# Altium footprint library User.PcbLib: 317 footprints (part 16 of 20)
Each footprint in its own frame and in the unit in brackets; x right, y up, seen from the top. Pads: shape width x height; smd on the part's side, far side on the other; paste and mask are expansions set on the pad; w line width, h text height; cw(c..) or ccw(c..) is an arc to the next point about the centre after c.
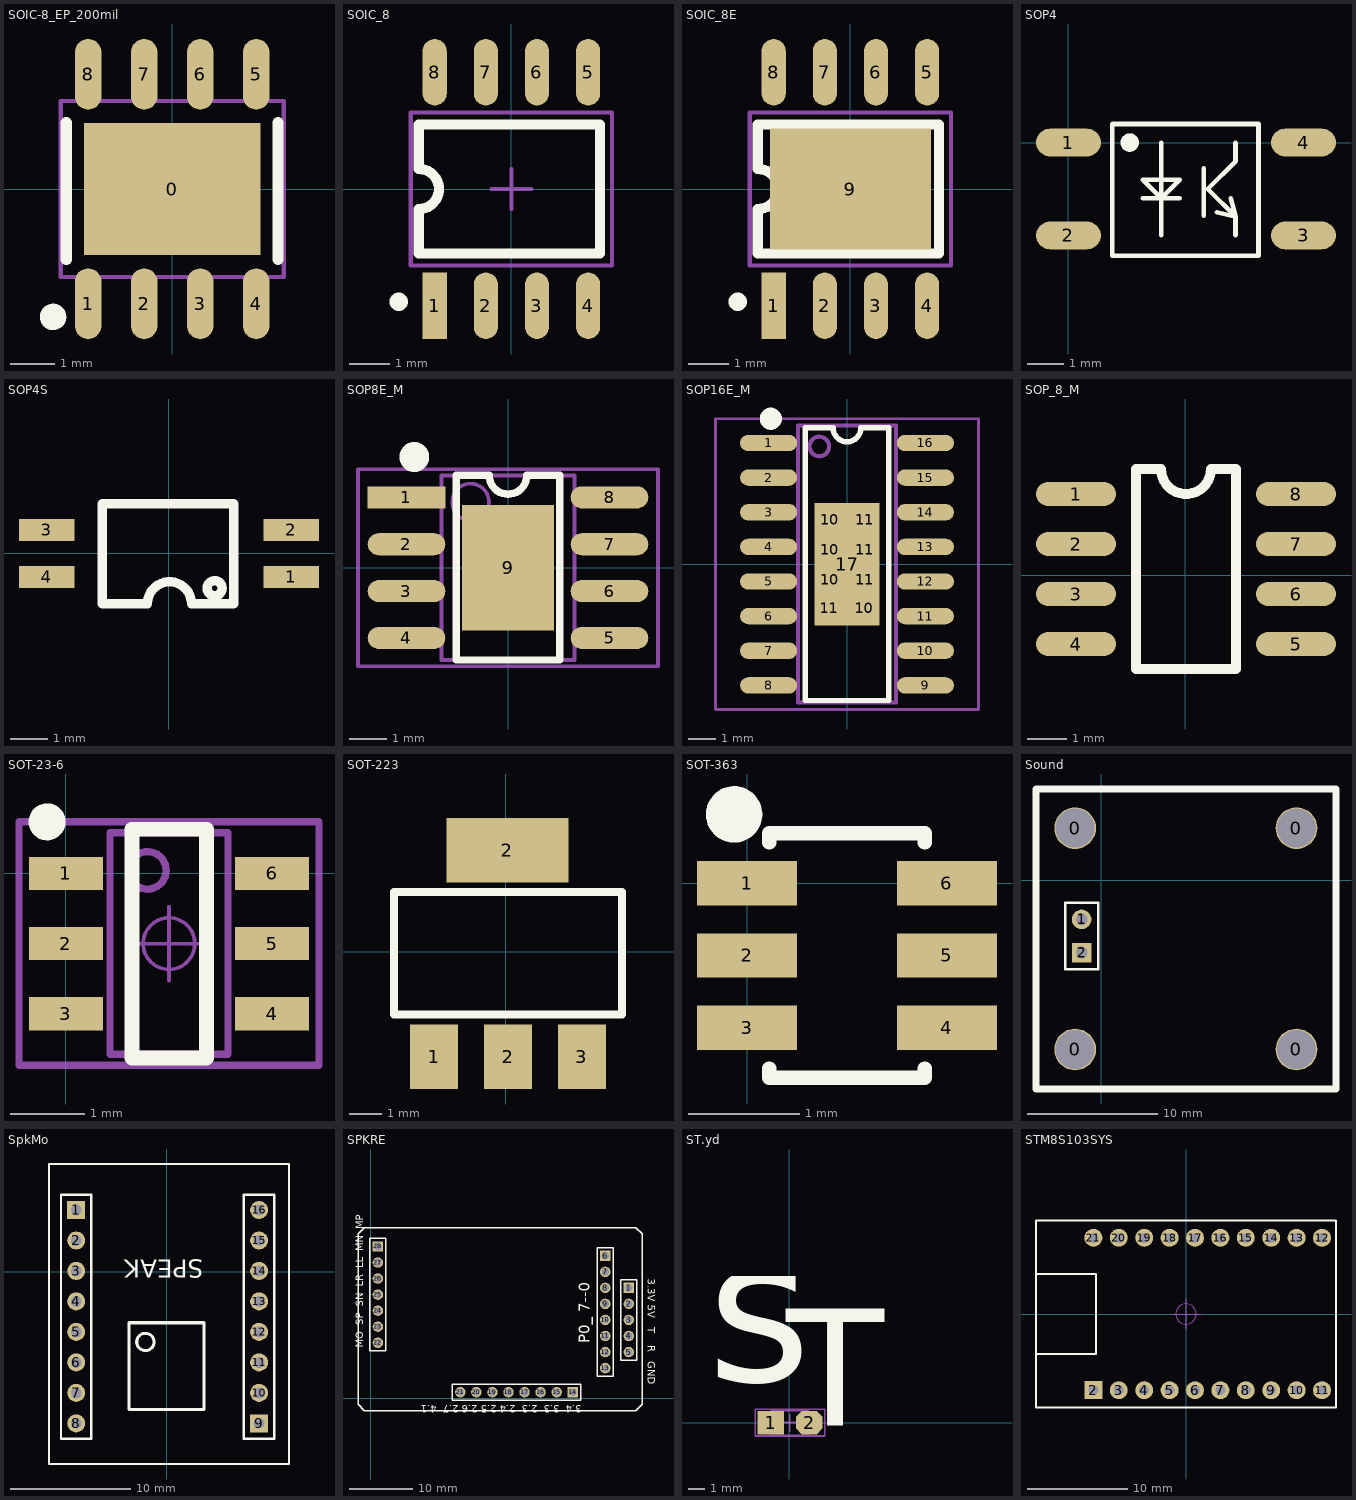
[diagram p15: the footprints below, top view; thin cyan lines are the x and y axes]

## SOIC-8_EP_200mil [mm] "52mm"
pads (9):
  rect 4x3 smd: 0(0,0)
  oval 0.6x1.6 smd: 1(-1.905,-2.6) 2(-0.635,-2.6) 3(0.635,-2.6) 4(1.905,-2.6) 5(1.905,2.6) 6(0.635,2.6) 7(-0.635,2.6) 8(-1.905,2.6)
Top Overlay:
  circle w0.3: c-2.7,-2.9 r0.15
  lines w0.254: -2.4,-1.6 -2.4,1.5 ; 2.4,-1.6 2.4,1.5
Mechanical 13:
  lines w0.1: -2.525,-1.995 -2.525,1.995 2.525,1.995 2.525,-1.995 -2.525,-1.995
3D body "SOIC8.STEP": height 1.75, standoff 0, extent -2.5,-3.006 2.5,3.006

## SOIC_8 [mm] "58mm"
pads (8):
  rect 0.6x1.65 smd: 1(-1.905,-2.9)
  oval 0.6x1.65 smd: 2(-0.635,-2.9) 3(0.635,-2.9) 4(1.905,-2.9) 5(1.905,2.9) 6(0.635,2.9) 7(-0.635,2.9) 8(-1.905,2.9)
Top Overlay:
  circle w0.254: c-2.8,-2.8 r0.1
  lines w0.254: -2.3,-1.6 2.2,-1.6 2.2,1.6 -2.3,1.6 -2.3,0.5 cw(c-2.3,0) -2.3,-0.5 -2.3,-1.6
Mechanical 15:
  lines w0.1: -0.5,0 0.5,0 ; 0,-0.5 0,0.5 ; -2.5,-1.9 2.5,-1.9 2.5,1.9 -2.5,1.9 -2.5,-1.9
3D body "SOIC8.STEP": height 1.75, standoff 0, extent -2.5,-3.006 2.5,3.006

## SOIC_8E [mm] "58mm"
pads (9):
  rect 0.6x1.65 smd: 1(-1.905,-2.9)
  oval 0.6x1.65 smd: 2(-0.635,-2.9) 3(0.635,-2.9) 4(1.905,-2.9) 5(1.905,2.9) 6(0.635,2.9) 7(-0.635,2.9) 8(-1.905,2.9)
  rect 4x3 smd: 9(0,0)
Top Overlay:
  circle w0.254: c-2.8,-2.8 r0.1
  lines w0.254: -2.3,-1.6 2.2,-1.6 2.2,1.6 -2.3,1.6 -2.3,0.5 cw(c-2.3,0) -2.3,-0.5 -2.3,-1.6
Mechanical 15:
  lines w0.1: -0.5,0 0.5,0 ; 0,-0.5 0,0.5 ; -2.5,-1.9 2.5,-1.9 2.5,1.9 -2.5,1.9 -2.5,-1.9
3D body "SOIC8.STEP": height 1.75, standoff 0, extent -2.5,-3.006 2.5,3.006

## SOP4 [mil] "AQY211G2S"
pads (4):
  oval 70x30 smd: 1(0,0) 2(0,-100) 3(253.23,-100) 4(253.23,0)
Top Overlay:
  circle w10: c65.94,0 r4.92
  lines w5: 80,-60 120,-60 ; 100,-100 100,0 ; 145.67,-78.74 145.67,-27.56 ; 160,-75 180,-80 ; 175,-60 180,-80 ; 180,-100 180,-80 ; 180,0 180,-20 150,-50 180,-80 ; 47.24,-121.73 47.24,20 204.72,20 204.72,-121.73 47.24,-121.73 ; 80,-40 120,-40 100,-60 80,-40
3D body "User Library-HCPL-181-1.STEP": height 78.74, standoff -3.96, extent -7.87,-122.05 267.72,19.69

## SOP4S [mm]
pads (4):
  rect 1.5x0.6 smd: 1(3.31,-0.635) 2(3.31,0.635) 3(-3.309,0.635) 4(-3.309,-0.635)
Top Overlay:
  circle w0.254: c1.235,-0.94 r0.203
  lines w0.254: -1.805,-1.361 -1.805,1.346 ; -1.794,-1.361 -0.582,-1.361 cw(c0.013,-1.361) 0.608,-1.361 1.751,-1.361 1.751,1.346 -1.786,1.346
3D body "SOP-4-1.step": height 2.1, standoff 0, extent -3.492,-1.397 3.507,1.403

## SOP8E_M [mm] "5.6*1.8mm（长宽高）"
height 1.75
pads (9):
  rect 2.1x0.6 smd: 1(-2.75,1.905)
  oval 2.1x0.6 smd: 2(-2.75,0.635) 3(-2.75,-0.635) 4(-2.75,-1.905) 5(2.75,-1.905) 6(2.75,-0.635) 7(2.75,0.635) 8(2.75,1.905)
  rect 2.5x3.4 smd paste-2: 9(0,0)
Top Overlay:
  circle w0.5: c-2.54,3 r0.155
  lines w0.2: -1.397,2.5 -1.397,-2.5 1.397,-2.5 1.397,2.5
  lines w0.203: -1.397,2.5 -0.508,2.5 ccw(c0,2.5) 0,1.992 ccw(c0,2.5) 0.508,2.5 1.397,2.5
Mechanical 13:
  circle w0.1: c-1.016,1.778 r0.5
  lines w0.1: -1.8,-2.5 1.8,-2.5 1.8,2.5 -1.8,2.5 -1.8,-2.5
Mechanical 15:
  circle w0.05: c0,0 r0.35
  lines w0.05: -0.5,0 0.5,0 ; 0,-0.5 0,0.5
  lines w0.1: -4.064,-2.667 4.064,-2.667 4.064,2.667 -4.064,2.667 -4.064,-2.667
3D body "ESOP8.STEP": height 1.53, standoff -0.01, extent -3.003,-2.5 3.003,2.5

## SOP16E_M [mm] "10.3*6.2*1.8mm（长宽高）"
height 1.75
pads (25):
  oval 2.1x0.6 smd: 1(-2.875,4.445) 2(-2.875,3.175) 3(-2.875,1.905) 4(-2.875,0.635) 5(-2.875,-0.635) 6(-2.875,-1.905) 7(-2.875,-3.175) 8(-2.875,-4.445) 9(2.875,-4.445) 10(2.875,-3.175) 11(2.875,-1.905) 12(2.875,-0.635) 13(2.875,0.635) 14(2.875,1.905) 15(2.875,3.175) 16(2.875,4.445)
  rect 0.9x0.7 on Top Paste: 10(-0.625,-0.575) 10(-0.625,0.525) 10(-0.625,1.625) 10(0.625,-1.625) 11(-0.65,-1.625) 11(0.65,-0.575) 11(0.65,0.525) 11(0.65,1.625)
  rect 2.4x4.5 smd paste-3: 17(0,0)
Top Overlay:
  circle w0.5: c-2.794,5.334 r0.155
  lines w0.2: -1.524,5 -1.524,-5 1.524,-5 1.524,5
  lines w0.203: -1.524,5 -0.508,5 ccw(c0,5) 0,4.492 ccw(c0,5) 0.508,5 1.524,5
Mechanical 13:
  circle w0.15: c-1.016,4.318 r0.359
  lines w0.15: -1.8,-5.08 1.8,-5.08 1.8,5.08 -1.8,5.08 -1.8,-5.08
Mechanical 15:
  circle w0.05: c0,0 r0.35
  lines w0.05: -0.5,0 0.5,0 ; 0,-0.5 0,0.5
  lines w0.1: -4.826,-5.334 -4.826,5.334 4.826,5.334 4.826,-5.334 -4.826,-5.334
3D body "ESOP16.STEP": height 1.53, standoff -0.03, extent -3.003,-5 3.003,5

## SOP_8_M [mil] "5.58"
pads (8):
  oval 80x24 smd: 1(-109,81) 2(-109,31) 3(-109,-19) 4(-109,-69) 5(111,-69) 6(111,-19) 7(111,31) 8(111,81)
Top Overlay:
  lines w10: -49,-94 51,-94 51,106 26,106 cw(c1,106) -24,106 -49,106 -49,-94
3D body "SOP8.STEP": height 62.99, standoff 0, extent -116.7,-91.62 121.17,106.02

## SOT-23-6 [mm]
pads (6):
  rect 1x0.45 smd: 1(0,0) 2(0,-0.95) 3(0,-1.9) 4(2.794,-1.9) 5(2.794,-0.95) 6(2.794,0)
Top Overlay:
  circle w0.25: c-0.254,0.7 r0.125
  lines w0.2: 0.897,-2.5 0.897,0.6 1.905,0.6 1.905,-2.5 0.897,-2.5
Mechanical 13:
  circle w0.1: c1.105,0.042 r0.254
  lines w0.1: 0.597,-2.45 2.197,-2.45 2.197,0.55 0.597,0.55 0.597,-2.45
Mechanical 15:
  circle w0.05: c1.397,-0.95 r0.35
  lines w0.05: 0.897,-0.95 1.897,-0.95 ; 1.397,-1.45 1.397,-0.45
  lines w0.1: -0.635,-2.6 3.429,-2.6 3.429,0.7 -0.635,0.7 -0.635,-2.6
3D body "SOT23-6.STEP": height 1.15, standoff -0.03, extent -0.007,-2.45 2.8,0.55

## SOT-223 [mil]
pads (4):
  rect 59x79 smd: 1(-88,-129) 2(2.55,-129) 3(93.1,-129)
  rect 150x79 smd: 2(1.88,124.54)
Top Overlay:
  lines w10: -137.45,-77 142.55,-77 142.55,73 -137.45,73 -137.45,-77
3D body "SOT-223_MP04A.STEP": height 66.93, standoff 0, extent -126.41,-137.72 129.5,136.3

## SOT-363 [mm] "ina199"
pads (6):
  rect 0.9x0.4 smd: 1(0,0) 2(0,-0.65) 3(0,-1.3) 4(1.8,-1.3) 5(1.8,-0.65) 6(1.8,0)
Top Overlay:
  circle w0.254: c-0.116,0.62 r0.127
  lines w0.127: 0.2,-1.668 0.2,-1.75 1.6,-1.75 1.6,-1.668 ; 0.2,0.368 0.2,0.45 1.6,0.45 1.6,0.368
3D body "User Library-SOT-23-6.STEP": height 1.08, standoff -0.01, extent -0.368,-2.032 2.057,0.762

## Sound [mm]
pads (6):
  round 3.2 hole 3: 0(-2,-12.97) 0(-2,4) 0(14.97,-12.97) 0(14.97,4)
  round 1.5 hole 0.9: 1(-1.5,-3)
  rect 1.5x1.5 hole 0.9: 2(-1.5,-5.54)
Top Overlay:
  lines w0.2: -2.77,-6.81 -0.23,-6.81 -0.23,-1.73 -2.77,-1.73 -2.77,-6.81
  lines w0.5: -5,-16 18,-16 18,7 -5,7 -5,-16
3D body: height 20, standoff 16, extent -5,-16 18,7

## SpkMo [mm]
pads (16):
  rect 1.5x1.5 hole 0.9: 1(-7.544,5.131) 9(7.696,-12.649)
  round 1.5 hole 0.9: 2(-7.544,2.591) 3(-7.544,0.051) 4(-7.544,-2.489) 5(-7.544,-5.029) 6(-7.544,-7.569) 7(-7.544,-10.109) 8(-7.544,-12.649) 10(7.696,-10.109) 11(7.696,-7.569) 12(7.696,-5.029) 13(7.696,-2.489) 14(7.696,0.051) 15(7.696,2.591) 16(7.696,5.131)
Top Overlay:
  circle w0.254: c-1.778,-5.867 r0.723
  lines w0.2: -9.811,-16.038 10.189,-16.038 10.189,8.962 -9.811,8.962 -9.811,-16.038 ; -8.814,-13.919 -8.814,6.401 -6.274,6.401 -6.274,-13.919 -8.814,-13.919 ; 6.426,-13.919 8.966,-13.919 8.966,6.401 6.426,6.401 6.426,-13.919
  lines w0.254: -3.161,-11.506 -3.161,-4.267 3.124,-4.267 3.124,-11.506 -3.161,-11.506
  text "SPEAK" at 3.052,1.5 h2.54
3D body "HEADER 2.54X8.stp": height -3.1, standoff -14.3, extent 6.447,-13.919 8.945,6.401
3D body "HEADER 2.54X8.stp": height -3.1, standoff -14.3, extent -8.793,-13.919 -6.295,6.401
3D body "ESOP8.STEP": height 13.53, standoff 11.99, extent -3.275,-11.393 2.73,-6.393
3D body: height 12, standoff 11, extent -9.804,-16.002 10.262,8.966
3D body "USB micro_D.STEP": height 14.79, standoff 11.05, extent -4.083,2.882 3.888,9.582

## SPKRE [mil] "SPKAI"
pads (28):
  rect 65x65 hole 47.24: 1(1609.37,686.89) 6(1462.37,886.88) 14(1259.37,37.01) 28(45.43,944.88)
  round 65 hole 47.24: 2(1609.37,586.89) 3(1609.37,486.89) 4(1609.37,386.89) 5(1609.37,286.89) 7(1462.37,786.88) 8(1462.37,686.88) 9(1462.37,586.88) 10(1462.37,486.88) 11(1462.37,386.88) 12(1462.37,286.88) 13(1462.37,186.88) 15(1159.37,37.01) 16(1059.37,37.01) 17(959.37,37.01) 18(859.37,37.01) 19(759.37,37.01) 20(659.37,37.01) 21(559.37,37.01) 22(45.43,344.88) 23(45.43,444.88) 24(45.43,544.88) 25(45.43,644.88) 26(45.43,744.88) 27(45.43,844.88)
Top Overlay:
  lines w7.87: -78.74,-39.37 -78.74,1023.62 -39.37,1062.99 1653.54,1062.99 1692.91,1023.62 1692.91,-39.37 1653.54,-78.74 39.37,-78.74 ; -78.61,-39.24 -39.24,-78.61 39.5,-78.61 ; -4.57,294.88 95.43,294.88 95.43,994.88 -4.57,994.88 -4.57,294.88 ; 509.37,-12.99 1309.37,-12.99 1309.37,87.01 509.37,87.01 509.37,-12.99 ; 1412.37,136.88 1512.37,136.88 1512.37,936.88 1412.37,936.88 1412.37,136.88 ; 1559.37,236.89 1659.37,236.89 1659.37,736.89 1559.37,736.89 1559.37,236.89
  text "MO  SP  SN  LR  LL  MN  MP" at -29.94,314 h78.74
  text "P0_ 7--0" at 1390,341 h118.11
  text "3.4  3.3  2.3  2.4 2.5 2.6 2.7  4.1" at 1316,-27.87 h78.74
  text "3.3V 5V   T    R   GND" at 1712.6,744.88 h78.74
Bottom Overlay:
  lines w7: 1495.37,136.88 1504.37,145.88
3D body: height 472.44, standoff 433.07, extent -81,-94 1696,1067

## ST.yd [mm]
pads (2):
  rect 1.6x1.4 smd: 1(-1.099,0.008)
  oct 1.6x1.4 smd: 2(1.201,0.008)
Top Overlay:
  text "T" at -0.178,-2.466 h12
  text "s" at -4.899,-0.542 h16
Top Solder:
  text "科技协会" at 2.565,-1.626 h5
Mechanical 13:
  lines w0.1: -1.064,-0.746 -1.064,0.733 1.136,0.733 1.136,-0.746 -1.064,-0.746
Mechanical 15:
  lines w0.1: -0.464,0.008 0.536,0.008 ; 0.036,-0.492 0.036,0.508 ; -2.024,-0.792 -2.024,0.808 2.126,0.808 2.126,-0.792 -2.024,-0.792
3D body "LED0805(R).STEP": height 1.1, standoff 0, extent -0.974,-0.617 1.046,0.633

## STM8S103SYS [mm] "STM8S103核心板"
pads (20):
  rect 1.8x1.8 hole 1 unplated: 2(-9.26,-7.62)
  round 1.8 hole 1 unplated: 3(-6.72,-7.62) 4(-4.18,-7.62) 5(-1.64,-7.62) 6(0.9,-7.62) 7(3.44,-7.62) 8(5.98,-7.62) 9(8.52,-7.62) 10(11.06,-7.62) 11(13.6,-7.62) 12(13.6,7.62) 13(11.06,7.62) 14(8.52,7.62) 15(5.98,7.62) 16(3.44,7.62) 17(0.9,7.62) 18(-1.64,7.62) 19(-4.18,7.62) 20(-6.72,7.62) 21(-9.26,7.62)
Top Overlay:
  lines w0.203: -15,-4 -9,-4 -9,4 -15,4 ; -15,-9.35 -15,9.35 15,9.35 15,-9.35 -15,-9.35
Mechanical 15:
  circle w0.1: c0,0 r1.016
  lines w0.1: -1.524,0 1.524,0 ; 0,-1.524 0,1.524
3D body "STM8S103SYS.STEP": height 6.33, standoff -6.01, extent -15,-9.35 15,9.35